# Altium integrated library Wuerth Elektronik Common Mode Power Line Choke.IntLib: 130 symbols (continued)
## 7446621010 (continued)
THT Common Mode Power Line Choke WE-LF, L = 10.0 mH; Inductance: 10.0 mH; DatasheetVersion: ver 3, Nov-2005; PackageVersion: 2005; PackageReference: WE-LF-SH; PackageDescription: THT Inductor, 4-Leads, Body 18.0 x 18.0 mm; ComponentLink1Description: Manufacturer URL; ComponentLink1URL: http://www.we-online.com; ComponentLink2Description: Datasheet; ComponentLink2URL: http://www.we-online.de/katalog/media/pdf/7446621010.pdf
footprint WE-LF-SH (THT Inductor, 4-Leads, Body 18.0x18.0x13.0 mm)
pins: 1, 2, 3, 4

## 7446622001
designator L?
THT Common Mode Power Line Choke WE-LF, L = 1.00 mH; Inductance: 1.00 mH; DatasheetVersion: ver 3, Nov-2005; PackageVersion: 2005; PackageReference: WE-LF-SH; PackageDescription: THT Inductor, 4-Leads, Body 18.0 x 18.0 mm; ComponentLink1Description: Manufacturer URL; ComponentLink1URL: http://www.we-online.com; ComponentLink2Description: Datasheet; ComponentLink2URL: http://www.we-online.de/katalog/media/pdf/7446622001.pdf
footprint WE-LF-SH (THT Inductor, 4-Leads, Body 18.0x18.0x13.0 mm)
pins: 1, 2, 3, 4

## 7446622002
designator L?
THT Common Mode Power Line Choke WE-LF, L = 2.20 mH; Inductance: 2.20 mH; DatasheetVersion: ver 3, Nov-2005; PackageVersion: 2005; PackageReference: WE-LF-SH; PackageDescription: THT Inductor, 4-Leads, Body 18.0 x 18.0 mm; ComponentLink1Description: Manufacturer URL; ComponentLink1URL: http://www.we-online.com; ComponentLink2Description: Datasheet; ComponentLink2URL: http://www.we-online.de/katalog/media/pdf/7446622002.pdf
footprint WE-LF-SH (THT Inductor, 4-Leads, Body 18.0x18.0x13.0 mm)
pins: 1, 2, 3, 4

## 7446622003
designator L?
THT Common Mode Power Line Choke WE-LF, L = 3.30 mH; Inductance: 3.30 mH; DatasheetVersion: ver 3, Nov-2005; PackageVersion: 2005; PackageReference: WE-LF-SH; PackageDescription: THT Inductor, 4-Leads, Body 18.0 x 18.0 mm; ComponentLink1Description: Manufacturer URL; ComponentLink1URL: http://www.we-online.com; ComponentLink2Description: Datasheet; ComponentLink2URL: http://www.we-online.de/katalog/media/pdf/7446622003.pdf
footprint WE-LF-SH (THT Inductor, 4-Leads, Body 18.0x18.0x13.0 mm)
pins: 1, 2, 3, 4

## 7446630027
designator L?
SMD Common Mode Power Line Choke WE-LF SMD, L = 27.0 mH; Inductance: 27.0 mH; DatasheetVersion: ver 2, May-2010; PackageVersion: 2010; PackageReference: WE-LF-SMD-SH; PackageDescription: SMD Inductor, 4-Leads, Body 18.5 x 23.3 mm; ComponentLink1Description: Manufacturer URL; ComponentLink1URL: http://www.we-online.com; ComponentLink2Description: Datasheet; ComponentLink2URL: http://www.we-online.de/katalog/media/pdf/7446630027.pdf
footprint WE-LF-SMD-SH (SMD Inductor, 4-Leads, Body 18.5x23.3x11.5 mm)
pins: 1, 2, 3, 4

## 7446630039
designator L?
SMD Common Mode Power Line Choke WE-LF SMD, L = 39.0 mH; Inductance: 39.0 mH; DatasheetVersion: ver 2, May-2010; PackageVersion: 2010; PackageReference: WE-LF-SMD-SH; PackageDescription: SMD Inductor, 4-Leads, Body 18.5 x 23.3 mm; ComponentLink1Description: Manufacturer URL; ComponentLink1URL: http://www.we-online.com; ComponentLink2Description: Datasheet; ComponentLink2URL: http://www.we-online.de/katalog/media/pdf/7446630039.pdf
footprint WE-LF-SMD-SH (SMD Inductor, 4-Leads, Body 18.5x23.3x11.5 mm)
pins: 1, 2, 3, 4

## 7446630047
designator L?
SMD Common Mode Power Line Choke WE-LF SMD, L = 47.0 mH; Inductance: 47.0 mH; DatasheetVersion: ver 2, May-2010; PackageVersion: 2010; PackageReference: WE-LF-SMD-SH; PackageDescription: SMD Inductor, 4-Leads, Body 18.5 x 23.3 mm; ComponentLink1Description: Manufacturer URL; ComponentLink1URL: http://www.we-online.com; ComponentLink2Description: Datasheet; ComponentLink2URL: http://www.we-online.de/katalog/media/pdf/7446630047.pdf
footprint WE-LF-SMD-SH (SMD Inductor, 4-Leads, Body 18.5x23.3x11.5 mm)
pins: 1, 2, 3, 4

## 7446631007
designator L?
SMD Common Mode Power Line Choke WE-LF SMD, L = 6.80 mH; Inductance: 6.80 mH; DatasheetVersion: ver 2, May-2010; PackageVersion: 2010; PackageReference: WE-LF-SMD-SH; PackageDescription: SMD Inductor, 4-Leads, Body 18.5 x 23.3 mm; ComponentLink1Description: Manufacturer URL; ComponentLink1URL: http://www.we-online.com; ComponentLink2Description: Datasheet; ComponentLink2URL: http://www.we-online.de/katalog/media/pdf/7446631007.pdf
footprint WE-LF-SMD-SH (SMD Inductor, 4-Leads, Body 18.5x23.3x11.5 mm)
pins: 1, 2, 3, 4

## 7446631010
designator L?
SMD Common Mode Power Line Choke WE-LF SMD, L = 10.0 mH; Inductance: 10.0 mH; DatasheetVersion: ver 2, May-2010; PackageVersion: 2010; PackageReference: WE-LF-SMD-SH; PackageDescription: SMD Inductor, 4-Leads, Body 18.5 x 23.3 mm; ComponentLink1Description: Manufacturer URL; ComponentLink1URL: http://www.we-online.com; ComponentLink2Description: Datasheet; ComponentLink2URL: http://www.we-online.de/katalog/media/pdf/7446631010.pdf
footprint WE-LF-SMD-SH (SMD Inductor, 4-Leads, Body 18.5x23.3x11.5 mm)
pins: 1, 2, 3, 4

## 7446632001
designator L?
SMD Common Mode Power Line Choke WE-LF SMD, L = 1.00 mH; Inductance: 1.00 mH; DatasheetVersion: ver 2, May-2010; PackageVersion: 2010; PackageReference: WE-LF-SMD-SH; PackageDescription: SMD Inductor, 4-Leads, Body 18.5 x 23.3 mm; ComponentLink1Description: Manufacturer URL; ComponentLink1URL: http://www.we-online.com; ComponentLink2Description: Datasheet; ComponentLink2URL: http://www.we-online.de/katalog/media/pdf/7446632001.pdf
footprint WE-LF-SMD-SH (SMD Inductor, 4-Leads, Body 18.5x23.3x11.5 mm)
pins: 1, 2, 3, 4

## 7446632002
designator L?
SMD Common Mode Power Line Choke WE-LF SMD, L = 2.20 mH; Inductance: 2.20 mH; DatasheetVersion: ver 2, May-2010; PackageVersion: 2010; PackageReference: WE-LF-SMD-SH; PackageDescription: SMD Inductor, 4-Leads, Body 18.5 x 23.3 mm; ComponentLink1Description: Manufacturer URL; ComponentLink1URL: http://www.we-online.com; ComponentLink2Description: Datasheet; ComponentLink2URL: http://www.we-online.de/katalog/media/pdf/7446632002.pdf
footprint WE-LF-SMD-SH (SMD Inductor, 4-Leads, Body 18.5x23.3x11.5 mm)
pins: 1, 2, 3, 4

## 7446632003
designator L?
SMD Common Mode Power Line Choke WE-LF SMD, L = 3.30 mH; Inductance: 3.30 mH; DatasheetVersion: ver 2, May-2010; PackageVersion: 2010; PackageReference: WE-LF-SMD-SH; PackageDescription: SMD Inductor, 4-Leads, Body 18.5 x 23.3 mm; ComponentLink1Description: Manufacturer URL; ComponentLink1URL: http://www.we-online.com; ComponentLink2Description: Datasheet; ComponentLink2URL: http://www.we-online.de/katalog/media/pdf/7446632003.pdf
footprint WE-LF-SMD-SH (SMD Inductor, 4-Leads, Body 18.5x23.3x11.5 mm)
pins: 1, 2, 3, 4

## 7446720047
designator L?
THT Common Mode Power Line Choke WE-LF, L = 47.0 mH; Inductance: 47.0 mH; DatasheetVersion: ver 3, Nov-2005; PackageVersion: 2005; PackageReference: WE-LF-MH; PackageDescription: THT Inductor, 4-Leads, Body 23.0 x 23.0 mm; ComponentLink1Description: Manufacturer URL; ComponentLink1URL: http://www.we-online.com; ComponentLink2Description: Datasheet; ComponentLink2URL: http://www.we-online.de/katalog/media/pdf/7446720047.pdf
footprint WE-LF-MH (THT Inductor, 4-Leads, Body 23.0x23.0x14.5 mm)
pins: 1, 2, 3, 4

## 7446721010
designator L?
THT Common Mode Power Line Choke WE-LF, L = 10.0 mH; Inductance: 10.0 mH; DatasheetVersion: ver 3, Nov-2005; PackageVersion: 2005; PackageReference: WE-LF-MH; PackageDescription: THT Inductor, 4-Leads, Body 23.0 x 23.0 mm; ComponentLink1Description: Manufacturer URL; ComponentLink1URL: http://www.we-online.com; ComponentLink2Description: Datasheet; ComponentLink2URL: http://www.we-online.de/katalog/media/pdf/7446721010.pdf
footprint WE-LF-MH (THT Inductor, 4-Leads, Body 23.0x23.0x14.5 mm)
pins: 1, 2, 3, 4

## 7446721027
designator L?
THT Common Mode Power Line Choke WE-LF, L = 27.0 mH; Inductance: 27.0 mH; DatasheetVersion: ver 3, Nov-2005; PackageVersion: 2005; PackageReference: WE-LF-MH; PackageDescription: THT Inductor, 4-Leads, Body 23.0 x 23.0 mm; ComponentLink1Description: Manufacturer URL; ComponentLink1URL: http://www.we-online.com; ComponentLink2Description: Datasheet; ComponentLink2URL: http://www.we-online.de/katalog/media/pdf/7446721027.pdf
footprint WE-LF-MH (THT Inductor, 4-Leads, Body 23.0x23.0x14.5 mm)
pins: 1, 2, 3, 4

## 7446722002
designator L?
THT Common Mode Power Line Choke WE-LF, L = 2.20 mH; Inductance: 2.20 mH; DatasheetVersion: ver 3, Nov-2005; PackageVersion: 2005; PackageReference: WE-LF-MH; PackageDescription: THT Inductor, 4-Leads, Body 23.0 x 23.0 mm; ComponentLink1Description: Manufacturer URL; ComponentLink1URL: http://www.we-online.com; ComponentLink2Description: Datasheet; ComponentLink2URL: http://www.we-online.de/katalog/media/pdf/7446722002.pdf
footprint WE-LF-MH (THT Inductor, 4-Leads, Body 23.0x23.0x14.5 mm)
pins: 1, 2, 3, 4

## 7446722004
designator L?
THT Common Mode Power Line Choke WE-LF, L = 4.20 mH; Inductance: 4.20 mH; DatasheetVersion: ver 3, Nov-2005; PackageVersion: 2005; PackageReference: WE-LF-MH; PackageDescription: THT Inductor, 4-Leads, Body 23.0 x 23.0 mm; ComponentLink1Description: Manufacturer URL; ComponentLink1URL: http://www.we-online.com; ComponentLink2Description: Datasheet; ComponentLink2URL: http://www.we-online.de/katalog/media/pdf/7446722004.pdf
footprint WE-LF-MH (THT Inductor, 4-Leads, Body 23.0x23.0x14.5 mm)
pins: 1, 2, 3, 4

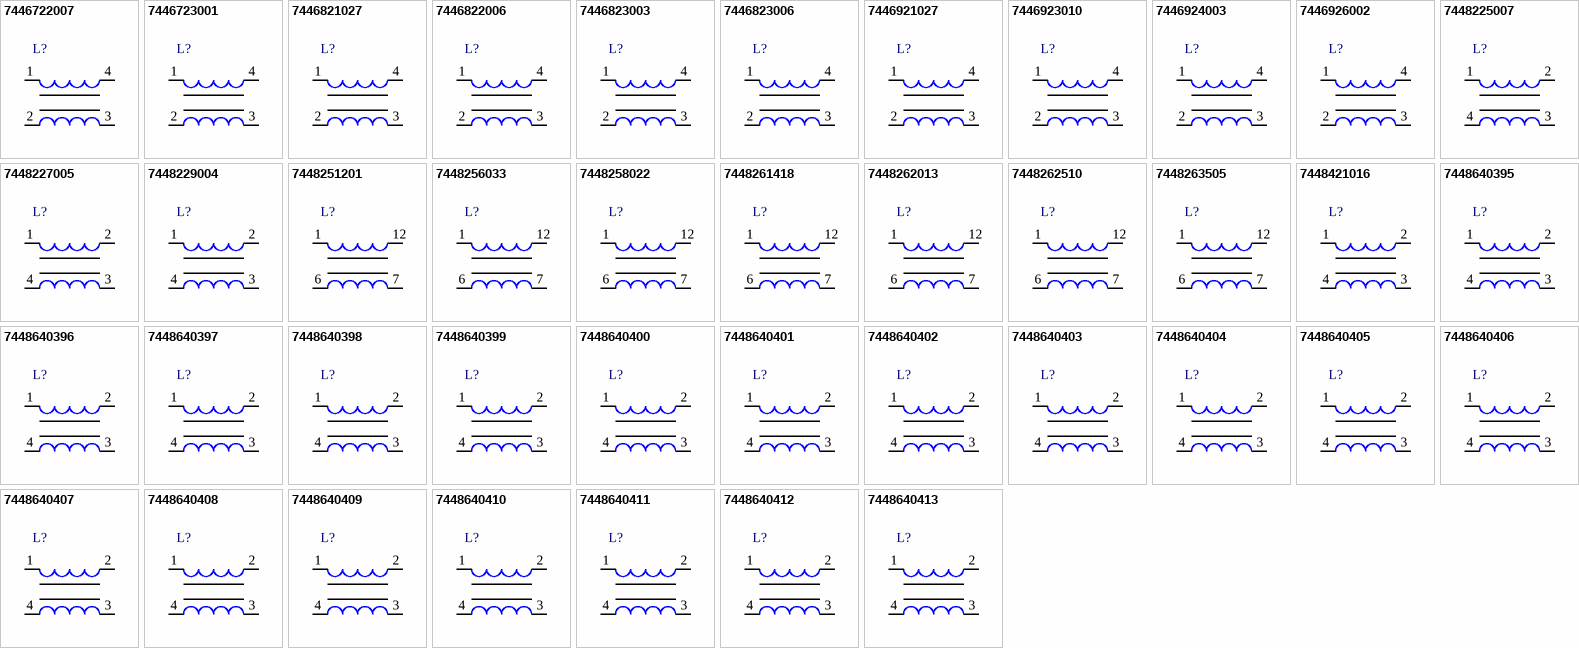
[diagram p2: symbols 7446722007 to 7448640413]

## 7446722007
designator L?
THT Common Mode Power Line Choke WE-LF, L = 6.80 mH; Inductance: 6.80 mH; DatasheetVersion: ver 3, Nov-2005; PackageVersion: 2005; PackageReference: WE-LF-MH; PackageDescription: THT Inductor, 4-Leads, Body 23.0 x 23.0 mm; ComponentLink1Description: Manufacturer URL; ComponentLink1URL: http://www.we-online.com; ComponentLink2Description: Datasheet; ComponentLink2URL: http://www.we-online.de/katalog/media/pdf/7446722007.pdf
footprint WE-LF-MH (THT Inductor, 4-Leads, Body 23.0x23.0x14.5 mm)
pins: 1, 2, 3, 4

## 7446723001
designator L?
THT Common Mode Power Line Choke WE-LF, L = 1.20 mH; Inductance: 1.20 mH; DatasheetVersion: ver 3, Nov-2005; PackageVersion: 2005; PackageReference: WE-LF-MH; PackageDescription: THT Inductor, 4-Leads, Body 23.0 x 23.0 mm; ComponentLink1Description: Manufacturer URL; ComponentLink1URL: http://www.we-online.com; ComponentLink2Description: Datasheet; ComponentLink2URL: http://www.we-online.de/katalog/media/pdf/7446723001.pdf
footprint WE-LF-MH (THT Inductor, 4-Leads, Body 23.0x23.0x14.5 mm)
pins: 1, 2, 3, 4

## 7446821027
designator L?
THT Common Mode Power Line Choke WE-LF, L = 27.0 mH; Inductance: 27.0 mH; DatasheetVersion: ver 3, Nov-2005; PackageVersion: 2005; PackageReference: WE-LF-LH; PackageDescription: THT Inductor, 4-Leads, Body 28.5 x 28.5 mm; ComponentLink1Description: Manufacturer URL; ComponentLink1URL: http://www.we-online.com; ComponentLink2Description: Datasheet; ComponentLink2URL: http://www.we-online.de/katalog/media/pdf/7446821027.pdf
footprint WE-LF-LH (THT Inductor, 4-Leads, Body 28.5x28.5x17.0 mm)
pins: 1, 2, 3, 4

## 7446822006
designator L?
THT Common Mode Power Line Choke WE-LF, L = 5.60 mH; Inductance: 5.60 mH; DatasheetVersion: ver 3, Nov-2005; PackageVersion: 2005; PackageReference: WE-LF-LH; PackageDescription: THT Inductor, 4-Leads, Body 28.5 x 28.5 mm; ComponentLink1Description: Manufacturer URL; ComponentLink1URL: http://www.we-online.com; ComponentLink2Description: Datasheet; ComponentLink2URL: http://www.we-online.de/katalog/media/pdf/7446822006.pdf
footprint WE-LF-LH (THT Inductor, 4-Leads, Body 28.5x28.5x17.0 mm)
pins: 1, 2, 3, 4

## 7446823003
designator L?
THT Common Mode Power Line Choke WE-LF, L = 2.70 mH; Inductance: 2.70 mH; DatasheetVersion: ver 3, Nov-2005; PackageVersion: 2005; PackageReference: WE-LF-LH; PackageDescription: THT Inductor, 4-Leads, Body 28.5 x 28.5 mm; ComponentLink1Description: Manufacturer URL; ComponentLink1URL: http://www.we-online.com; ComponentLink2Description: Datasheet; ComponentLink2URL: http://www.we-online.de/katalog/media/pdf/7446823003.pdf
footprint WE-LF-LH (THT Inductor, 4-Leads, Body 28.5x28.5x17.0 mm)
pins: 1, 2, 3, 4

## 7446823006
designator L?
THT Common Mode Power Line Choke WE-LF, L = 5.60 mH; Inductance: 5.60 mH; DatasheetVersion: ver 3, Nov-2005; PackageVersion: 2005; PackageReference: WE-LF-LH; PackageDescription: THT Inductor, 4-Leads, Body 28.5 x 28.5 mm; ComponentLink1Description: Manufacturer URL; ComponentLink1URL: http://www.we-online.com; ComponentLink2Description: Datasheet; ComponentLink2URL: http://www.we-online.de/katalog/media/pdf/7446823006.pdf
footprint WE-LF-LH (THT Inductor, 4-Leads, Body 28.5x28.5x17.0 mm)
pins: 1, 2, 3, 4

## 7446921027
designator L?
THT Common Mode Power Line Choke WE-LF, L = 27.0 mH; Inductance: 27.0 mH; DatasheetVersion: ver 3, Nov-2005; PackageVersion: 2005; PackageReference: WE-LF-XH; PackageDescription: THT Inductor, 4-Leads, Body 33.5 x 33.5 mm; ComponentLink1Description: Manufacturer URL; ComponentLink1URL: http://www.we-online.com; ComponentLink2Description: Datasheet; ComponentLink2URL: http://www.we-online.de/katalog/media/pdf/7446921027.pdf
footprint WE-LF-XH (THT Inductor, 4-Leads, Body 33.5x33.5x20.0 mm)
pins: 1, 2, 3, 4

## 7446923010
designator L?
THT Common Mode Power Line Choke WE-LF, L = 10.0 mH; Inductance: 10.0 mH; DatasheetVersion: ver 3, Nov-2005; PackageVersion: 2005; PackageReference: WE-LF-XH; PackageDescription: THT Inductor, 4-Leads, Body 33.5 x 33.5 mm; ComponentLink1Description: Manufacturer URL; ComponentLink1URL: http://www.we-online.com; ComponentLink2Description: Datasheet; ComponentLink2URL: http://www.we-online.de/katalog/media/pdf/7446923010.pdf
footprint WE-LF-XH (THT Inductor, 4-Leads, Body 33.5x33.5x20.0 mm)
pins: 1, 2, 3, 4

## 7446924003
designator L?
THT Common Mode Power Line Choke WE-LF, L = 3.30 mH; Inductance: 3.30 mH; DatasheetVersion: ver 3, Nov-2005; PackageVersion: 2005; PackageReference: WE-LF-XH; PackageDescription: THT Inductor, 4-Leads, Body 33.5 x 33.5 mm; ComponentLink1Description: Manufacturer URL; ComponentLink1URL: http://www.we-online.com; ComponentLink2Description: Datasheet; ComponentLink2URL: http://www.we-online.de/katalog/media/pdf/7446924003.pdf
footprint WE-LF-XH (THT Inductor, 4-Leads, Body 33.5x33.5x20.0 mm)
pins: 1, 2, 3, 4

## 7446926002
designator L?
THT Common Mode Power Line Choke WE-LF, L = 1.80 mH; Inductance: 1.80 mH; DatasheetVersion: ver 3, Nov-2005; PackageVersion: 2005; PackageReference: WE-LF-XH; PackageDescription: THT Inductor, 4-Leads, Body 33.5 x 33.5 mm; ComponentLink1Description: Manufacturer URL; ComponentLink1URL: http://www.we-online.com; ComponentLink2Description: Datasheet; ComponentLink2URL: http://www.we-online.de/katalog/media/pdf/7446926002.pdf
footprint WE-LF-XH (THT Inductor, 4-Leads, Body 33.5x33.5x20.0 mm)
pins: 1, 2, 3, 4

## 7448225007
designator L?
THT Common Mode Power Line Choke WE-CMB HC, L = 700 µH; Inductance: 700 µH; DatasheetVersion: ver 1, Jan-2009; PackageVersion: 2009; PackageReference: WE-CMB-HC-S; PackageDescription: THT Inductor, 4-Leads, Body 18.5 x 14.5 mm; ComponentLink1Description: Manufacturer URL; ComponentLink1URL: http://www.we-online.com; ComponentLink2Description: Datasheet; ComponentLink2URL: http://www.we-online.de/katalog/media/pdf/7448225007.pdf
footprint WE-CMB-HC-S (THT Inductor, 4-Leads, Body 18.5x14.5x22.0 mm)
pins: 1, 2, 3, 4

## 7448227005
designator L?
THT Common Mode Power Line Choke WE-CMB HC, L = 450 µH; Inductance: 450 µH; DatasheetVersion: ver 1, Jan-2009; PackageVersion: 2009; PackageReference: WE-CMB-HC-S; PackageDescription: THT Inductor, 4-Leads, Body 18.5 x 14.5 mm; ComponentLink1Description: Manufacturer URL; ComponentLink1URL: http://www.we-online.com; ComponentLink2Description: Datasheet; ComponentLink2URL: http://www.we-online.de/katalog/media/pdf/7448227005.pdf
footprint WE-CMB-HC-S (THT Inductor, 4-Leads, Body 18.5x14.5x22.0 mm)
pins: 1, 2, 3, 4

## 7448229004
designator L?
THT Common Mode Power Line Choke WE-CMB HC, L = 350 µH; Inductance: 350 µH; DatasheetVersion: ver 1, Jan-2009; PackageVersion: 2009; PackageReference: WE-CMB-HC-S; PackageDescription: THT Inductor, 4-Leads, Body 18.5 x 14.5 mm; ComponentLink1Description: Manufacturer URL; ComponentLink1URL: http://www.we-online.com; ComponentLink2Description: Datasheet; ComponentLink2URL: http://www.we-online.de/katalog/media/pdf/7448229004.pdf
footprint WE-CMB-HC-S (THT Inductor, 4-Leads, Body 18.5x14.5x22.0 mm)
pins: 1, 2, 3, 4

## 7448251201
designator L?
THT Common Mode Power Line Choke WE-CMB, L = 1.00 mH; Inductance: 1.00 mH; DatasheetVersion: ver 5, Nov-2004; PackageVersion: 2004; PackageReference: WE-CMB-XL; PackageDescription: THT Inductor, 4-Leads, Body 30.0 x 21.0 mm; ComponentLink1Description: Manufacturer URL; ComponentLink1URL: http://www.we-online.com; ComponentLink2Description: Datasheet; ComponentLink2URL: http://www.we-online.de/katalog/media/pdf/7448251201.pdf
footprint WE-CMB-XL (THT Inductor, 4-Leads, Body 30.0x21.0x35.0 mm)
pins: 1, 6, 7, 12

## 7448256033
designator L?
THT Common Mode Power Line Choke WE-CMB, L = 3.30 mH; Inductance: 3.30 mH; DatasheetVersion: ver 4, Oct-2004; PackageVersion: 2004; PackageReference: WE-CMB-XL; PackageDescription: THT Inductor, 4-Leads, Body 30.0 x 21.0 mm; ComponentLink1Description: Manufacturer URL; ComponentLink1URL: http://www.we-online.com; ComponentLink2Description: Datasheet; ComponentLink2URL: http://www.we-online.de/katalog/media/pdf/7448256033.pdf
footprint WE-CMB-XL (THT Inductor, 4-Leads, Body 30.0x21.0x35.0 mm)
pins: 1, 6, 7, 12

## 7448258022
designator L?
THT Common Mode Power Line Choke WE-CMB, L = 2.20 mH; Inductance: 2.20 mH; DatasheetVersion: ver 4, Oct-2004; PackageVersion: 2004; PackageReference: WE-CMB-XL; PackageDescription: THT Inductor, 4-Leads, Body 30.0 x 21.0 mm; ComponentLink1Description: Manufacturer URL; ComponentLink1URL: http://www.we-online.com; ComponentLink2Description: Datasheet; ComponentLink2URL: http://www.we-online.de/katalog/media/pdf/7448258022.pdf
footprint WE-CMB-XL (THT Inductor, 4-Leads, Body 30.0x21.0x35.0 mm)
pins: 1, 6, 7, 12

## 7448261418
designator L?
THT Common Mode Power Line Choke WE-CMB, L = 1.80 mH; Inductance: 1.80 mH; DatasheetVersion: ver 2, Aug-2008; PackageVersion: 2008; PackageReference: WE-CMB-XXL; PackageDescription: THT Inductor, 4-Leads, Body 43.5 x 23.5 mm; ComponentLink1Description: Manufacturer URL; ComponentLink1URL: http://www.we-online.com; ComponentLink2Description: Datasheet; ComponentLink2URL: http://www.we-online.de/katalog/media/pdf/7448261418.pdf
footprint WE-CMB-XXL (THT Inductor, 4-Leads, Body 43.5x23.5x43.0 mm)
pins: 1, 6, 7, 12

## 7448262013
designator L?
THT Common Mode Power Line Choke WE-CMB, L = 1.30 mH; Inductance: 1.30 mH; DatasheetVersion: ver 2, Aug-2008; PackageVersion: 2008; PackageReference: WE-CMB-XXL; PackageDescription: THT Inductor, 4-Leads, Body 43.5 x 23.5 mm; ComponentLink1Description: Manufacturer URL; ComponentLink1URL: http://www.we-online.com; ComponentLink2Description: Datasheet; ComponentLink2URL: http://www.we-online.de/katalog/media/pdf/7448262013.pdf
footprint WE-CMB-XXL (THT Inductor, 4-Leads, Body 43.5x23.5x43.0 mm)
pins: 1, 6, 7, 12

## 7448262510
designator L?
THT Common Mode Power Line Choke WE-CMB, L = 1.00 mH; Inductance: 1.00 mH; DatasheetVersion: ver 2, Aug-2008; PackageVersion: 2008; PackageReference: WE-CMB-XXL; PackageDescription: THT Inductor, 4-Leads, Body 43.5 x 23.5 mm; ComponentLink1Description: Manufacturer URL; ComponentLink1URL: http://www.we-online.com; ComponentLink2Description: Datasheet; ComponentLink2URL: http://www.we-online.de/katalog/media/pdf/7448262510.pdf
footprint WE-CMB-XXL (THT Inductor, 4-Leads, Body 43.5x23.5x43.0 mm)
pins: 1, 6, 7, 12

## 7448263505
designator L?
THT Common Mode Power Line Choke WE-CMB, L = 0.50 mH; Inductance: 0.50 mH; DatasheetVersion: ver 2, Aug-2008; PackageVersion: 2008; PackageReference: WE-CMB-XXL; PackageDescription: THT Inductor, 4-Leads, Body 43.5 x 23.5 mm; ComponentLink1Description: Manufacturer URL; ComponentLink1URL: http://www.we-online.com; ComponentLink2Description: Datasheet; ComponentLink2URL: http://www.we-online.de/katalog/media/pdf/7448263505.pdf
footprint WE-CMB-XXL (THT Inductor, 4-Leads, Body 43.5x23.5x43.0 mm)
pins: 1, 6, 7, 12

## 7448421016
designator L?
THT Common Mode Power Line Choke WE-CMB NiZn, L = 16.0 µH; Inductance: 16.0 µH; DatasheetVersion: Aug-2008; PackageVersion: 2008; PackageReference: WE-CMB-HC-S-A; PackageDescription: THT Inductor, 4-Leads, Body 18.5 x 14.5 mm; ComponentLink1Description: Manufacturer URL; ComponentLink1URL: http://www.we-online.com; ComponentLink2Description: Datasheet; ComponentLink2URL: http://www.we-online.de/katalog/media/pdf/7448421016.pdf
footprint WE-CMB-HC-S-A (THT Inductor, 4-Leads, Body 18.5x14.5x22.0 mm)
pins: 1, 2, 3, 4

## 7448640395
designator L?
THT Common Mode Power Line Choke WE-FC, L = 0.82 mH; Inductance: 0.82 mH; DatasheetVersion: ver 1, Aug-2009; PackageVersion: 2009; PackageReference: WE-FC-ET; PackageDescription: THT Inductor, 4-Leads, Body 21.2 x 21.2 mm; ComponentLink1Description: Manufacturer URL; ComponentLink1URL: http://www.we-online.com; ComponentLink2Description: Datasheet; ComponentLink2URL: http://www.we-online.de/katalog/media/pdf/7448640395.pdf
footprint WE-FC-ET (THT Inductor, 4-Leads, Body 21.2x21.2x17.8 mm)
pins: 1, 2, 3, 4

## 7448640396
designator L?
THT Common Mode Power Line Choke WE-FC, L = 1.80 mH; Inductance: 1.80 mH; DatasheetVersion: ver 1, Aug-2009; PackageVersion: 2009; PackageReference: WE-FC-ET; PackageDescription: THT Inductor, 4-Leads, Body 21.2 x 21.2 mm; ComponentLink1Description: Manufacturer URL; ComponentLink1URL: http://www.we-online.com; ComponentLink2Description: Datasheet; ComponentLink2URL: http://www.we-online.de/katalog/media/pdf/7448640396.pdf
footprint WE-FC-ET (THT Inductor, 4-Leads, Body 21.2x21.2x17.8 mm)
pins: 1, 2, 3, 4

## 7448640397
designator L?
THT Common Mode Power Line Choke WE-FC, L = 2.70 mH; Inductance: 2.70 mH; DatasheetVersion: ver 1, Aug-2009; PackageVersion: 2009; PackageReference: WE-FC-ET; PackageDescription: THT Inductor, 4-Leads, Body 21.2 x 21.2 mm; ComponentLink1Description: Manufacturer URL; ComponentLink1URL: http://www.we-online.com; ComponentLink2Description: Datasheet; ComponentLink2URL: http://www.we-online.de/katalog/media/pdf/7448640397.pdf
footprint WE-FC-ET (THT Inductor, 4-Leads, Body 21.2x21.2x17.8 mm)
pins: 1, 2, 3, 4

## 7448640398
designator L?
THT Common Mode Power Line Choke WE-FC, L = 3.30 mH; Inductance: 3.30 mH; DatasheetVersion: ver 1, Aug-2009; PackageVersion: 2009; PackageReference: WE-FC-ET; PackageDescription: THT Inductor, 4-Leads, Body 21.2 x 21.2 mm; ComponentLink1Description: Manufacturer URL; ComponentLink1URL: http://www.we-online.com; ComponentLink2Description: Datasheet; ComponentLink2URL: http://www.we-online.de/katalog/media/pdf/7448640398.pdf
footprint WE-FC-ET (THT Inductor, 4-Leads, Body 21.2x21.2x17.8 mm)
pins: 1, 2, 3, 4

## 7448640399
designator L?
THT Common Mode Power Line Choke WE-FC, L = 3.9 mH; Inductance: 3.9 mH; DatasheetVersion: ver 1, Aug-2009; PackageVersion: 2009; PackageReference: WE-FC-ET; PackageDescription: THT Inductor, 4-Leads, Body 21.2 x 21.2 mm; ComponentLink1Description: Manufacturer URL; ComponentLink1URL: http://www.we-online.com; ComponentLink2Description: Datasheet; ComponentLink2URL: http://www.we-online.de/katalog/media/pdf/7448640399.pdf
footprint WE-FC-ET (THT Inductor, 4-Leads, Body 21.2x21.2x17.8 mm)
pins: 1, 2, 3, 4

## 7448640400
designator L?
THT Common Mode Power Line Choke WE-FC, L = 5.60 mH; Inductance: 5.60 mH; DatasheetVersion: ver 1, Aug-2009; PackageVersion: 2009; PackageReference: WE-FC-ET; PackageDescription: THT Inductor, 4-Leads, Body 21.2 x 21.2 mm; ComponentLink1Description: Manufacturer URL; ComponentLink1URL: http://www.we-online.com; ComponentLink2Description: Datasheet; ComponentLink2URL: http://www.we-online.de/katalog/media/pdf/7448640400.pdf
footprint WE-FC-ET (THT Inductor, 4-Leads, Body 21.2x21.2x17.8 mm)
pins: 1, 2, 3, 4

## 7448640401
designator L?
THT Common Mode Power Line Choke WE-FC, L = 6.80 mH; Inductance: 6.80 mH; DatasheetVersion: ver 1, Aug-2009; PackageVersion: 2009; PackageReference: WE-FC-ET; PackageDescription: THT Inductor, 4-Leads, Body 21.2 x 21.2 mm; ComponentLink1Description: Manufacturer URL; ComponentLink1URL: http://www.we-online.com; ComponentLink2Description: Datasheet; ComponentLink2URL: http://www.we-online.de/katalog/media/pdf/7448640401.pdf
footprint WE-FC-ET (THT Inductor, 4-Leads, Body 21.2x21.2x17.8 mm)
pins: 1, 2, 3, 4

## 7448640402
designator L?
THT Common Mode Power Line Choke WE-FC, L = 10.0 mH; Inductance: 10.0 mH; DatasheetVersion: ver 1, Aug-2009; PackageVersion: 2009; PackageReference: WE-FC-ET; PackageDescription: THT Inductor, 4-Leads, Body 21.2 x 21.2 mm; ComponentLink1Description: Manufacturer URL; ComponentLink1URL: http://www.we-online.com; ComponentLink2Description: Datasheet; ComponentLink2URL: http://www.we-online.de/katalog/media/pdf/7448640402.pdf
footprint WE-FC-ET (THT Inductor, 4-Leads, Body 21.2x21.2x17.8 mm)
pins: 1, 2, 3, 4

## 7448640403
designator L?
THT Common Mode Power Line Choke WE-FC, L = 18.0 mH; Inductance: 18.0 mH; DatasheetVersion: ver 1, Aug-2009; PackageVersion: 2009; PackageReference: WE-FC-ET; PackageDescription: THT Inductor, 4-Leads, Body 21.2 x 21.2 mm; ComponentLink1Description: Manufacturer URL; ComponentLink1URL: http://www.we-online.com; ComponentLink2Description: Datasheet; ComponentLink2URL: http://www.we-online.de/katalog/media/pdf/7448640403.pdf
footprint WE-FC-ET (THT Inductor, 4-Leads, Body 21.2x21.2x17.8 mm)
pins: 1, 2, 3, 4

## 7448640404
designator L?
THT Common Mode Power Line Choke WE-FC, L = 22.0 mH; Inductance: 22.0 mH; DatasheetVersion: ver 1, Aug-2009; PackageVersion: 2009; PackageReference: WE-FC-ET; PackageDescription: THT Inductor, 4-Leads, Body 21.2 x 21.2 mm; ComponentLink1Description: Manufacturer URL; ComponentLink1URL: http://www.we-online.com; ComponentLink2Description: Datasheet; ComponentLink2URL: http://www.we-online.de/katalog/media/pdf/7448640404.pdf
footprint WE-FC-ET (THT Inductor, 4-Leads, Body 21.2x21.2x17.8 mm)
pins: 1, 2, 3, 4

## 7448640405
designator L?
THT Common Mode Power Line Choke WE-FC, L = 33.0 mH; Inductance: 33.0 mH; DatasheetVersion: ver 1, Aug-2009; PackageVersion: 2009; PackageReference: WE-FC-ET; PackageDescription: THT Inductor, 4-Leads, Body 21.2 x 21.2 mm; ComponentLink1Description: Manufacturer URL; ComponentLink1URL: http://www.we-online.com; ComponentLink2Description: Datasheet; ComponentLink2URL: http://www.we-online.de/katalog/media/pdf/7448640405.pdf
footprint WE-FC-ET (THT Inductor, 4-Leads, Body 21.2x21.2x17.8 mm)
pins: 1, 2, 3, 4

## 7448640406
designator L?
THT Common Mode Power Line Choke WE-FC, L = 0.82 mH; Inductance: 0.82 mH; DatasheetVersion: ver 1, Aug-2009; PackageVersion: 2009; PackageReference: WE-FC-UT; PackageDescription: THT Inductor, 4-Leads, Body 21.2 x 16.6 mm; ComponentLink1Description: Manufacturer URL; ComponentLink1URL: http://www.we-online.com; ComponentLink2Description: Datasheet; ComponentLink2URL: http://www.we-online.de/katalog/media/pdf/7448640406.pdf
footprint WE-FC-UT (THT Inductor, 4-Leads, Body 21.2x16.6x22.5 mm)
pins: 1, 2, 3, 4

## 7448640407
designator L?
THT Common Mode Power Line Choke WE-FC, L = 1.20 mH; Inductance: 1.20 mH; DatasheetVersion: ver 1, Aug-2009; PackageVersion: 2009; PackageReference: WE-FC-UT; PackageDescription: THT Inductor, 4-Leads, Body 21.2 x 16.6 mm; ComponentLink1Description: Manufacturer URL; ComponentLink1URL: http://www.we-online.com; ComponentLink2Description: Datasheet; ComponentLink2URL: http://www.we-online.de/katalog/media/pdf/7448640407.pdf
footprint WE-FC-UT (THT Inductor, 4-Leads, Body 21.2x16.6x22.5 mm)
pins: 1, 2, 3, 4

## 7448640408
designator L?
THT Common Mode Power Line Choke WE-FC, L = 1.80 mH; Inductance: 1.80 mH; DatasheetVersion: ver 1, Aug-2009; PackageVersion: 2009; PackageReference: WE-FC-UT; PackageDescription: THT Inductor, 4-Leads, Body 21.2 x 16.6 mm; ComponentLink1Description: Manufacturer URL; ComponentLink1URL: http://www.we-online.com; ComponentLink2Description: Datasheet; ComponentLink2URL: http://www.we-online.de/katalog/media/pdf/7448640408.pdf
footprint WE-FC-UT (THT Inductor, 4-Leads, Body 21.2x16.6x22.5 mm)
pins: 1, 2, 3, 4

## 7448640409
designator L?
THT Common Mode Power Line Choke WE-FC, L = 2.20 mH; Inductance: 2.20 mH; DatasheetVersion: ver 1, Aug-2009; PackageVersion: 2009; PackageReference: WE-FC-UT; PackageDescription: THT Inductor, 4-Leads, Body 21.2 x 16.6 mm; ComponentLink1Description: Manufacturer URL; ComponentLink1URL: http://www.we-online.com; ComponentLink2Description: Datasheet; ComponentLink2URL: http://www.we-online.de/katalog/media/pdf/7448640409.pdf
footprint WE-FC-UT (THT Inductor, 4-Leads, Body 21.2x16.6x22.5 mm)
pins: 1, 2, 3, 4

## 7448640410
designator L?
THT Common Mode Power Line Choke WE-FC, L = 2.70 mH; Inductance: 2.70 mH; DatasheetVersion: ver 1, Aug-2009; PackageVersion: 2009; PackageReference: WE-FC-UT; PackageDescription: THT Inductor, 4-Leads, Body 21.2 x 16.6 mm; ComponentLink1Description: Manufacturer URL; ComponentLink1URL: http://www.we-online.com; ComponentLink2Description: Datasheet; ComponentLink2URL: http://www.we-online.de/katalog/media/pdf/7448640410.pdf
footprint WE-FC-UT (THT Inductor, 4-Leads, Body 21.2x16.6x22.5 mm)
pins: 1, 2, 3, 4

## 7448640411
designator L?
THT Common Mode Power Line Choke WE-FC, L = 3.30 mH; Inductance: 3.30 mH; DatasheetVersion: ver 1, Aug-2009; PackageVersion: 2009; PackageReference: WE-FC-UT; PackageDescription: THT Inductor, 4-Leads, Body 21.2 x 16.6 mm; ComponentLink1Description: Manufacturer URL; ComponentLink1URL: http://www.we-online.com; ComponentLink2Description: Datasheet; ComponentLink2URL: http://www.we-online.de/katalog/media/pdf/7448640411.pdf
footprint WE-FC-UT (THT Inductor, 4-Leads, Body 21.2x16.6x22.5 mm)
pins: 1, 2, 3, 4

## 7448640412
designator L?
THT Common Mode Power Line Choke WE-FC, L = 3.90 mH; Inductance: 3.90 mH; DatasheetVersion: ver 1, Aug-2009; PackageVersion: 2009; PackageReference: WE-FC-UT; PackageDescription: THT Inductor, 4-Leads, Body 21.2 x 16.6 mm; ComponentLink1Description: Manufacturer URL; ComponentLink1URL: http://www.we-online.com; ComponentLink2Description: Datasheet; ComponentLink2URL: http://www.we-online.de/katalog/media/pdf/7448640412.pdf
footprint WE-FC-UT (THT Inductor, 4-Leads, Body 21.2x16.6x22.5 mm)
pins: 1, 2, 3, 4

## 7448640413
designator L?
THT Common Mode Power Line Choke WE-FC, L = 5.60 mH; Inductance: 5.60 mH; DatasheetVersion: ver 1, Aug-2009; PackageVersion: 2009; PackageReference: WE-FC-UT; PackageDescription: THT Inductor, 4-Leads, Body 21.2 x 16.6 mm; ComponentLink1Description: Manufacturer URL; ComponentLink1URL: http://www.we-online.com; ComponentLink2Description: Datasheet; ComponentLink2URL: http://www.we-online.de/katalog/media/pdf/7448640413.pdf
footprint WE-FC-UT (THT Inductor, 4-Leads, Body 21.2x16.6x22.5 mm)
pins: 1, 2, 3, 4

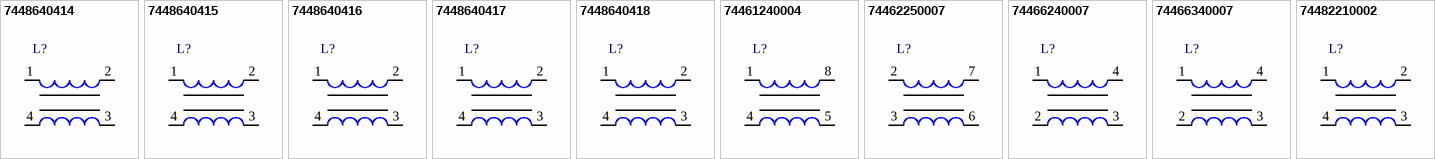
[diagram p3: symbols 7448640414 to 74482210002]

## 7448640414
designator L?
THT Common Mode Power Line Choke WE-FC, L = 6.80 mH; Inductance: 6.80 mH; DatasheetVersion: ver 1, Aug-2009; PackageVersion: 2009; PackageReference: WE-FC-UT; PackageDescription: THT Inductor, 4-Leads, Body 21.2 x 16.6 mm; ComponentLink1Description: Manufacturer URL; ComponentLink1URL: http://www.we-online.com; ComponentLink2Description: Datasheet; ComponentLink2URL: http://www.we-online.de/katalog/media/pdf/7448640414.pdf
footprint WE-FC-UT (THT Inductor, 4-Leads, Body 21.2x16.6x22.5 mm)
pins: 1, 2, 3, 4

## 7448640415
designator L?
THT Common Mode Power Line Choke WE-FC, L = 10.0 mH; Inductance: 10.0 mH; DatasheetVersion: ver 1, Aug-2009; PackageVersion: 2009; PackageReference: WE-FC-UT; PackageDescription: THT Inductor, 4-Leads, Body 21.2 x 16.6 mm; ComponentLink1Description: Manufacturer URL; ComponentLink1URL: http://www.we-online.com; ComponentLink2Description: Datasheet; ComponentLink2URL: http://www.we-online.de/katalog/media/pdf/7448640415.pdf
footprint WE-FC-UT (THT Inductor, 4-Leads, Body 21.2x16.6x22.5 mm)
pins: 1, 2, 3, 4

## 7448640416
designator L?
THT Common Mode Power Line Choke WE-FC, L = 18.0 mH; Inductance: 18.0 mH; DatasheetVersion: ver 1, Aug-2009; PackageVersion: 2009; PackageReference: WE-FC-UT; PackageDescription: THT Inductor, 4-Leads, Body 21.2 x 16.6 mm; ComponentLink1Description: Manufacturer URL; ComponentLink1URL: http://www.we-online.com; ComponentLink2Description: Datasheet; ComponentLink2URL: http://www.we-online.de/katalog/media/pdf/7448640416.pdf
footprint WE-FC-UT (THT Inductor, 4-Leads, Body 21.2x16.6x22.5 mm)
pins: 1, 2, 3, 4

## 7448640417
designator L?
THT Common Mode Power Line Choke WE-FC, L = 22.0 mH; Inductance: 22.0 mH; DatasheetVersion: ver 1, Aug-2009; PackageVersion: 2009; PackageReference: WE-FC-UT; PackageDescription: THT Inductor, 4-Leads, Body 21.2 x 16.6 mm; ComponentLink1Description: Manufacturer URL; ComponentLink1URL: http://www.we-online.com; ComponentLink2Description: Datasheet; ComponentLink2URL: http://www.we-online.de/katalog/media/pdf/7448640417.pdf
footprint WE-FC-UT (THT Inductor, 4-Leads, Body 21.2x16.6x22.5 mm)
pins: 1, 2, 3, 4

## 7448640418
designator L?
THT Common Mode Power Line Choke WE-FC, L = 33.0 mH; Inductance: 33.0 mH; DatasheetVersion: ver 1, Aug-2009; PackageVersion: 2009; PackageReference: WE-FC-UT; PackageDescription: THT Inductor, 4-Leads, Body 21.2 x 16.6 mm; ComponentLink1Description: Manufacturer URL; ComponentLink1URL: http://www.we-online.com; ComponentLink2Description: Datasheet; ComponentLink2URL: http://www.we-online.de/katalog/media/pdf/7448640418.pdf
footprint WE-FC-UT (THT Inductor, 4-Leads, Body 21.2x16.6x22.5 mm)
pins: 1, 2, 3, 4

## 74461240004
designator L?
THT Common Mode Power Line Choke WE-LF, L = 0.40 mH; Inductance: 0.40 mH; DatasheetVersion: ver 2, Nov-2005; PackageVersion: 2005; PackageReference: WE-LF-SV; PackageDescription: THT Inductor, 4-Leads, Body 18.5 x 13.5 mm; ComponentLink1Description: Manufacturer URL; ComponentLink1URL: http://www.we-online.com; ComponentLink2Description: Datasheet; ComponentLink2URL: http://www.we-online.de/katalog/media/pdf/74461240004.pdf
footprint WE-LF-SV (THT Inductor, 4-Leads, Body 18.5x13.5x20.5 mm)
pins: 1, 4, 5, 8

## 74462250007
designator L?
THT Common Mode Power Line Choke WE-LF, L = 0.70 mH; Inductance: 0.70 mH; DatasheetVersion: ver 3, Nov-2005; PackageVersion: 2005; PackageReference: WE-LF-MV; PackageDescription: THT Inductor, 4-Leads, Body 23.5 x 16.0 mm; ComponentLink1Description: Manufacturer URL; ComponentLink1URL: http://www.we-online.com; ComponentLink2Description: Datasheet; ComponentLink2URL: http://www.we-online.de/katalog/media/pdf/74462250007.pdf
footprint WE-LF-MV (THT Inductor, 4-Leads, Body 23.5x16.0x25.5 mm)
pins: 2, 3, 6, 7

## 74466240007
designator L?
THT Common Mode Power Line Choke WE-LF, L = 0.70 mH; Inductance: 0.70 mH; DatasheetVersion: ver 3, Nov-2005; PackageVersion: 2005; PackageReference: WE-LF-SH; PackageDescription: THT Inductor, 4-Leads, Body 18.0 x 18.0 mm; ComponentLink1Description: Manufacturer URL; ComponentLink1URL: http://www.we-online.com; ComponentLink2Description: Datasheet; ComponentLink2URL: http://www.we-online.de/katalog/media/pdf/74466240007.pdf
footprint WE-LF-SH (THT Inductor, 4-Leads, Body 18.0x18.0x13.0 mm)
pins: 1, 2, 3, 4

## 74466340007
designator L?
SMD Common Mode Power Line Choke WE-LF SMD, L = 0.70 mH; Inductance: 0.70 mH; DatasheetVersion: ver 2, May-2010; PackageVersion: 2010; PackageReference: WE-LF-SMD-SH; PackageDescription: SMD Inductor, 4-Leads, Body 18.5 x 23.3 mm; ComponentLink1Description: Manufacturer URL; ComponentLink1URL: http://www.we-online.com; ComponentLink2Description: Datasheet; ComponentLink2URL: http://www.we-online.de/katalog/media/pdf/74466340007.pdf
footprint WE-LF-SMD-SH (SMD Inductor, 4-Leads, Body 18.5x23.3x11.5 mm)
pins: 1, 2, 3, 4

## 74482210002
designator L?
THT Common Mode Power Line Choke WE-CMB HC, L = 175 µH; Inductance: 175 µH; DatasheetVersion: ver 1, Jan-2009; PackageVersion: 2009; PackageReference: WE-CMB-HC-S; PackageDescription: THT Inductor, 4-Leads, Body 18.5 x 14.5 mm; ComponentLink1Description: Manufacturer URL; ComponentLink1URL: http://www.we-online.com; ComponentLink2Description: Datasheet; ComponentLink2URL: http://www.we-online.de/katalog/media/pdf/74482210002.pdf
footprint WE-CMB-HC-S (THT Inductor, 4-Leads, Body 18.5x14.5x22.0 mm)
pins: 1, 2, 3, 4